# Altium footprint library TH Connectors.PcbLib: 140 footprints (part 1 of 9)
Each footprint in its own frame and in the unit in brackets; x right, y up, seen from the top. Pads: shape width x height; smd on the part's side, far side on the other; paste and mask are expansions set on the pad; w line width, h text height; cw(c..) or ccw(c..) is an arc to the next point about the centre after c.
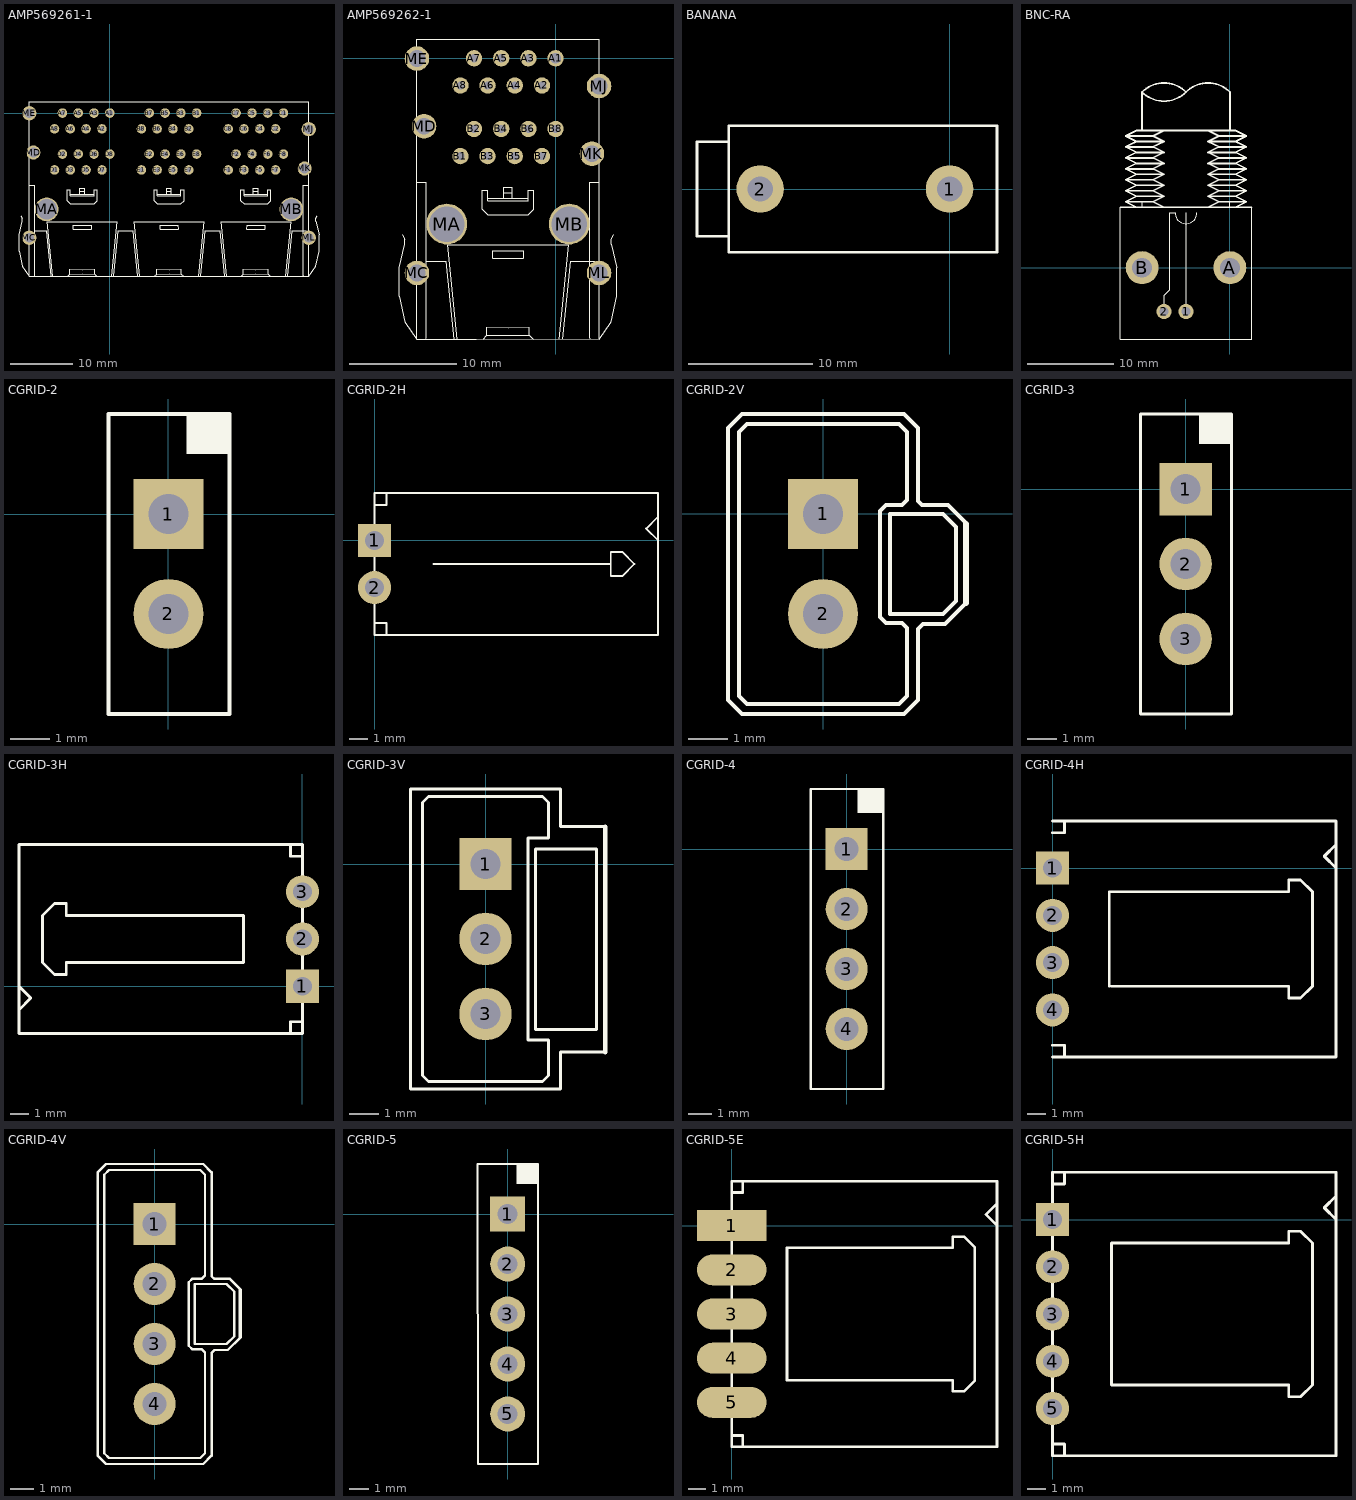
[diagram p0: the footprints below, top view; thin cyan lines are the x and y axes]

## AMP569261-1 [mil]
pads (56):
  round 60 hole 40: A1(0,0)
  round 60 hole 30: A2(-50,-100) A3(-100,0) A4(-150,-100) A5(-200,0) A6(-250,-100) A7(-300,0) A8(-350,-100) B1(550,0) B2(500,-100) B3(450,0) B4(400,-100) B5(350,0) B6(300,-100) B7(250,0) B8(200,-100) C1(1100,0) C2(1050,-100) C3(1000,0) C4(950,-100) C5(900,0) C6(850,-100) C7(800,0) C8(750,-100) D1(-350,-360) D2(-300,-260) D3(-250,-360) D4(-200,-260) D5(-150,-360) D6(-100,-260) D7(-50,-360) D8(0,-260) E1(200,-360) E2(250,-260) E3(300,-360) E4(350,-260) E5(400,-360) E6(450,-260) E7(500,-360) E8(550,-260) F1(750,-360) F2(800,-260) F3(850,-360) F4(900,-260) F5(950,-360) F6(1000,-260) F7(1050,-360) F8(1100,-260)
  round 150 hole 131 unplated: MA(-400,-610) MB(1150,-610)
  round 90 hole 62: MC(-510,-790) MD(-484,-250) ME(-510,-1) MJ(1260,-102) MK(1234,-351) ML(1260,-790)
Top Overlay:
  drawing of 160 lines, arcs and shapes, not listed

## AMP569262-1 [mil]
pads (24):
  round 60 hole 40: A1(0,0)
  round 60 hole 30: A2(-50,-100) A3(-100,0) A4(-150,-100) A5(-200,0) A6(-250,-100) A7(-300,0) A8(-350,-100) B1(-350,-360) B2(-300,-260) B3(-250,-360) B4(-200,-260) B5(-150,-360) B6(-100,-260) B7(-50,-360) B8(0,-260)
  round 150 hole 131 unplated: MA(-400,-610) MB(50,-610)
  round 90 hole 62: MC(-510,-790) MD(-484,-250) ME(-510,-1) MJ(160,-102) MK(134,-351) ML(160,-790)
Top Overlay:
  lines w4: -565,-650 -555,-665 -555,-685 -575,-770 -575,-875 -555,-970 -510,-1033 ; -510,-456 -476,-456 -476,-1031 -478,-1033 ; -510,-117 -510,71 160,71 160,-117 ; -510,48 -510,-790 -510,-1033 ; -476,-746 -404,-746 -375,-1033 ; -363,-1033 -398,-687 48,-687 ; -267,-1033 -254,-1020 ; -250,-515 -175,-515 -100,-515 ; -190,-515 -190,-495 ; -160,-515 -160,-495 ; -83,-1033 -96,-1020 ; 128,-1033 126,-1031 126,-456 160,-456 ; 159,-1032 -292,-1033 -510,-1033 ; 160,48 160,-790 160,-1033 205,-970 225,-875 225,-770 205,-685 205,-665 215,-650 ; -254,-1020 -175,-1019 -96,-1020 ; -254,-1020 -254,-990 -175,-991 -96,-990 -96,-1020 ; -190,-495 -190,-475 -175,-475 -160,-475 -160,-495 ; -190,-495 -175,-495 -160,-495 ; 48,-687 13,-1033 48,-687 ; 55,-746 103,-746 55,-746 ; 55,-746 26,-1033 55,-746 ; -270,-555 -270,-485 -250,-485 -250,-525 -175,-525 -100,-525 -100,-485 -80,-485 -80,-555 -100,-575 -175,-575 -250,-575 -270,-555 ; -232,-736 -175,-736 -118,-736 -119,-709 -175,-709 -231,-709 -232,-736 ; 97,-746 145,-746 97,-746

## BANANA [mil]
pads (2):
  round 150 hole 80: 1(0,0) 2(-600,0)
Top Overlay:
  lines w8: -700,-200 -700,-150 ; -700,-200 150,-200 ; -700,-200 150,-200 ; -700,-150 -700,200 ; -700,-150 -800,-150 -800,150 -700,150 -700,200 ; -700,200 -600,200 150,200 150,-200

## BNC-RA [mil]
pads (4):
  round 70 hole 40: 1(-200,-200) 2(-300,-200)
  round 150 hole 90: A(0,0) B(-400,0)
Top Overlay:
  lines w4: -400,275 -400,300 ; -325,275 100,275 ; -300,-200 -300,-125 -275,-100 -275,250 -250,250 ccw(c-200,250) -150,250 ; -300,275 -500,275 -500,25 -500,-325 100,-325 100,275 ; -200,-200 -200,200 -200,250 -200,225 ; 0,275 0,300 ; 100,-225 100,275
  lines w8: -500,275 100,275 ; -425,275 -475,300 ; -400.17,799.83 ccw(c-300,900) -199.83,799.83 ; -400.17,800.17 cw(c-300,700) -199.83,800.17 ; -400,625 -400,800 ; -300,275 -350,300 ; -200.17,800.17 cw(c-100,700) 0.17,800.17 ; -100,275 -50,300 ; 0,625 0,800 ; 25,275 75,300 ; -475,300 -350,300 ; -475,300 -425,325 ; -475,350 -350,350 ; -475,350 -425,375 ; -475,350 -425,325 ; -475,400 -350,400 ; -475,400 -425,425 ; -475,400 -425,375 ; -475,450 -350,450 ; -475,450 -425,475 ; -475,450 -425,425 ; -475,500 -350,500 ; -475,500 -425,525 ; -475,500 -425,475 ; -475,550 -350,550 ; -475,550 -425,575 ; -475,550 -425,525 ; -475,600 -350,600 ; -475,600 -425,625 ; -475,600 -425,575 ; -425,325 -300,325 ; -425,375 -300,375 ; -425,425 -300,425 ; -425,475 -300,475 ; -425,525 -300,525 ; -425,575 -300,575 ; -425,625 -300,625 -350,600 ; -425,625 25,625 ; -350,300 -300,325 ; -350,350 -300,375 ; -350,350 -300,325 ; -350,400 -300,425 ; -350,400 -300,375 ; -350,450 -300,475 ; -350,450 -300,425 ; -350,500 -300,525 ; -350,500 -300,475 ; -350,550 -300,575 ; -350,550 -300,525 ; -350,600 -300,575 ; -100,325 25,325 ; -100,325 -50,350 ; -100,325 -50,300 ; -100,375 25,375 ; -100,375 -50,400 ; -100,375 -50,350 ; -100,425 25,425 ; -100,425 -50,450 ; -100,425 -50,400 ; -100,475 25,475 ; -100,475 -50,500 ; -100,475 -50,450 ; -100,525 25,525 ; -100,525 -50,550 ; -100,525 -50,500 ; -100,575 25,575 ; -100,575 -50,600 ; -100,575 -50,550 ; -50,300 75,300 ; -50,350 75,350 ; -50,400 75,400 ; -50,450 75,450 ; -50,500 75,500 ; -50,550 75,550 ; -50,600 75,600 ; -50,600 -100,625 25,625 ; 25,325 75,350 ; 25,325 75,300 ; 25,375 75,400 ; 25,375 75,350 ; 25,425 75,450 ; 25,425 75,400 ; 25,475 75,500 ; 25,475 75,450 ; 25,525 75,550 ; 25,525 75,500 ; 25,575 75,600 ; 25,575 75,550 ; 25,625 75,600
3D body: height 619.21, standoff -168.19, extent -490,-280 91.1,1127.48

## CGRID-2 [mil]
pads (2):
  rect 70x70 hole 40: 1(0,0)
  round 70 hole 40: 2(0,-100)
Top Overlay:
  rectangle: 18,60 61,100
  lines w4: -60,-200 -60,100 61,100 61,-200 -60,-200

## CGRID-2H [mil]
pads (2):
  rect 70x70 hole 40: 1(0,0)
  round 70 hole 40: 2(0,-100)
Top Overlay:
  lines w4: 0,-175 25,-175 25,-200 ; 0,75 25,75 25,100 ; 600,-200 150,-200 0,-200 0,100 150,100 300,100 450,100 600,100 600,-199 ; 600,0 575,25 600,50 ; 500,-50 500,-25 525,-25 550,-50 525,-75 500,-75 500,-50 ; 500,-50 125,-50 500,-50

## CGRID-2V [mil]
pads (2):
  rect 70x70 hole 40: 1(0,0)
  round 70 hole 40: 2(0,-100)
Top Overlay:
  lines w4: 133,-87 120,-100 95,-100 ; 133,-86 133,-13 120,0 95,0 67,0 67,-100 ; 143,-89 122,-110 100,-110 95,-115 95,-186 81,-200 0,-200 ; 143,-9 125,9 99,9 95,13 95,86 81,100 0,100 -81,100 -95,86 -95,-186 -81,-200 0,-200 ; 0,-200 0,-200 ; 67,-100 95,-100 ; 67,-100 95,-100 ; -84,-182 -76,-190 0,-190 76,-190 84,-182 84,-114 79,-109 63,-109 57,-103 57,3 63,9 79,9 84,14 84,82 76,90 0,90 -76,90 -84,82 -84,-41 -84,-182
  lines w6: 143,-89 143,-10

## CGRID-3 [mil]
pads (3):
  rect 70x70 hole 40: 1(0,0)
  round 70 hole 40: 2(0,-100) 3(0,-200)
Top Overlay:
  rectangle: 18,60 61,100
  lines w4: -60,-300 61,-300 61,100 -60,100 -60,-300

## CGRID-3H [mil]
pads (3):
  rect 70x70 hole 40: 1(0,0)
  round 70 hole 40: 2(0,100) 3(0,200)
Top Overlay:
  lines w6: -600,-50 -575,-25 -600,0 ; -25,-100 -25,-75 0,-75 ; -25,300 -25,275 0,275 ; -550,50 -550,150 ; -550,50 -550,150 ; -550,50 -525,25 -500,25 -500,50 -125,50 ; -550,150 -525,175 -500,175 -500,150 -125,150 ; -125,50 -125,150 ; -125,50 -125,150 ; -600,-100 -600,300 -150,300 0,300 0,-100 -150,-100 -300,-100 -450,-100 -600,-100

## CGRID-3V [mil]
pads (3):
  rect 70x70 hole 40: 1(0,0)
  round 70 hole 40: 2(0,-100) 3(0,-200)
Top Overlay:
  lines w4: 160,-251 100,-251 100,-300 0,-300 ; 160,50 100,50 100,100 0,100 -100,100 -100,-300 0,-300 ; 0,-300 0,-300 ; -84,-282 -84,-41 -84,82 -76,90 0,90 76,90 84,82 84,35 57,35 57,-235 84,-235 84,-282 76,-290 0,-290 -76,-290 -84,-282 ; 67,-221 148,-221 148,20 67,20 67,-221
  lines w6: 160,-251 160,50
3D body: height 300, standoff 0, extent 69,-35 100,20
3D body: height 300, standoff 0, extent 69,-220 100,-166
3D body: height 470, standoff 0, extent -100,-300 -69,100
3D body: height 360, standoff -120, extent -15,-15.25 15,14.75
3D body: height 360, standoff -120, extent -15,-115.25 15,-85.25
3D body: height 360, standoff -120, extent -15,-215.25 15,-185.25
3D body: height 120, standoff 0, extent -100,-300 100,100
3D body: height 470, standoff 0, extent 69,19 100,100
3D body: height 470, standoff 0, extent -100,69 100,100
3D body: height 470, standoff 0, extent -100,-300 100,-269
3D body: height 470, standoff 0, extent 69,-300 100,-220
3D body: height 470, standoff 300, extent 99,-251 160,-220
3D body: height 470, standoff 300, extent 100,19 160,50
3D body: height 470, standoff 300, extent 129,-10 160,50
3D body: height 470, standoff 300, extent 129,-251 160,-191
3D body: height 470, standoff 400, extent 129,-191 160,-10

## CGRID-4 [mil]
pads (4):
  rect 70x70 hole 40: 1(0,0)
  round 70 hole 40: 2(0,-100) 3(0,-200) 4(0,-300)
Top Overlay:
  rectangle: 18,60 61,100
  lines w4: -60,-400 -60,100 61,100 61,-400 -60,-400

## CGRID-4H [mil]
pads (4):
  rect 70x70 hole 40: 1(0,0)
  round 70 hole 40: 2(0,-100) 3(0,-200) 4(0,-300)
Top Overlay:
  lines w6: 0,-400 150,-400 600,-400 600,100 450,100 300,100 150,100 0,100 ; 0,-375 25,-375 25,-400 ; 0,75 25,75 25,100 ; 125,-250 500,-250 500,-275 525,-275 550,-250 ; 600,0 575,25 600,50 ; 120,-50 500,-50 500,-25 525,-25 550,-50 ; 120,-50 120,-250 120,-50 ; 550,-250 550,-50 ; 550,-250 550,-50

## CGRID-4V [mil]
pads (4):
  rect 70x70 hole 40: 1(0,0)
  round 70 hole 40: 2(0,-100) 3(0,-200) 4(0,-300)
Top Overlay:
  lines w4: -95,-386 -81,-400 0,-400 ; -95,-385 -95,86 -81,100 0,100 81,100 95,86 95,-87 99,-91 125,-91 143,-109 ; -84,-382 -76,-390 0,-390 76,-390 84,-382 ; -84,-380 -84,-41 -84,82 -76,90 0,90 76,90 84,82 84,-41 84,-86 79,-91 63,-91 57,-97 57,-203 63,-209 79,-209 84,-214 ; 84,-380 84,-215 ; 95,-386 81,-400 0,-400 ; 95,-385 95,-216 ; 95,-215 100,-210 122,-210 143,-189 ; 133,-187 120,-200 95,-200 ; 133,-186 133,-113 120,-100 95,-100 67,-100 67,-200 ; 0,-400 0,-400 ; 67,-200 95,-200 ; 67,-200 95,-200
  lines w6: 143,-189 143,-110
3D body: height 465, standoff -130, extent -100,-400 160,100

## CGRID-5 [mil]
pads (5):
  rect 70x70 hole 40: 1(0,0)
  round 70 hole 40: 2(0,-100) 3(0,-200) 4(0,-300) 5(0,-400)
Top Overlay:
  rectangle: 18,60 61,100
  lines w4: -60,-500 61,-500 61,100 -60,100 -60,-500

## CGRID-5E [mil]
pads (5):
  rect 157.48x70 smd: 1(0,0)
  oval 157.48x70 smd: 2(0,-100) 3(0,-200) 4(0,-300) 5(0,-400)
Top Overlay:
  lines w6: 0,-475 25,-475 25,-500 ; 0,75 25,75 25,100 ; 600,0 575,25 600,50 ; 125,-350 125,-50 ; 125,-350 500,-350 500,-375 525,-375 550,-350 ; 125,-350 125,-50 ; 125,-50 500,-50 500,-25 525,-25 550,-50 ; 550,-350 550,-50 ; 550,-350 550,-50 ; 0,-500 150,-500 600,-500 600,100 450,100 300,100 150,100 0,100 0,-500

## CGRID-5H [mil]
pads (5):
  rect 70x70 hole 40: 1(0,0)
  round 70 hole 40: 2(0,-100) 3(0,-200) 4(0,-300) 5(0,-400)
Top Overlay:
  lines w6: 0,-475 25,-475 25,-500 ; 0,75 25,75 25,100 ; 600,0 575,25 600,50 ; 125,-350 125,-50 ; 125,-350 500,-350 500,-375 525,-375 550,-350 ; 125,-350 125,-50 ; 125,-50 500,-50 500,-25 525,-25 550,-50 ; 550,-350 550,-50 ; 550,-350 550,-50 ; 0,-500 0,100 150,100 300,100 450,100 600,100 600,-500 150,-500 0,-500